# Altium schematic symbol library jlcpcb_2025_04_capacitors_extended_0402.schlib: 3594 symbols (part 13 of 20) (continued)
## GCM1555C1H120FA16D
designator C?  Capacitance: 12pF  (hidden comment: *)
Capacitor, Ceramic (MLCC), 12pF, ±1%, 50V, C0G, ±1%, SMD 0402; Manufacturer: Murata Electronics; Manufacturer Part Number: GCM1555C1H120FA16D; Package Size: 0402; JLCPCB Basic Part: No; JLCPCB Part Number: C393682; Supplier 1: LCSC; Category: Capacitors - MLCC; Supplier Part Number 1: C393682; Tolerance: ±1%; Voltage Rating: 50V; Temperature Coefficient: C0G; RoHS: Yes; ComponentLink1Description: Datasheet; ComponentLink1URL: https://wmsc.lcsc.com/wmsc/upload/file/pdf/v2/lcsc/2304140030_Murata-Electronics-GCM1555C1H120FA16D_C393682.pdf; ComponentLink2Description: JLCPCB Part URL; ComponentLink2URL: https://jlcpcb.com/partdetail/C393682; ComponentLink3Description: LCSC Part URL; ComponentLink3URL: https://lcsc.com/product-detail/Multilayer-Ceramic-Capacitors-MLCC---SMD-SMT_Murata-Electronics-Murata-Electronics-GCM1555C1H120FA16D_C393682.html
footprint CAP-0402 (0402 (1005M) Capacitor)
pins: 1, 2

## GCM1555C1H120FA16J
designator C?  Capacitance: 12pF  (hidden comment: *)
Capacitor, Ceramic (MLCC), 12pF, ±1%, 50V, ±1%, SMD 0402; Manufacturer: Murata Electronics; Manufacturer Part Number: GCM1555C1H120FA16J; Package Size: 0402; JLCPCB Basic Part: No; JLCPCB Part Number: C2168812; Supplier 1: LCSC; Category: Capacitors - MLCC; Supplier Part Number 1: C2168812; Tolerance: ±1%; Voltage Rating: 50V; RoHS: Yes; ComponentLink1Description: Datasheet; ComponentLink1URL: https://wmsc.lcsc.com/wmsc/upload/file/pdf/v2/lcsc/2202040330_Murata-Electronics-GCM1555C1H120FA16J_C2168812.pdf; ComponentLink2Description: JLCPCB Part URL; ComponentLink2URL: https://jlcpcb.com/partdetail/C2168812; ComponentLink3Description: LCSC Part URL; ComponentLink3URL: https://lcsc.com/product-detail/Multilayer-Ceramic-Capacitors-MLCC---SMD-SMT_Murata-Electronics-Murata-Electronics-GCM1555C1H120FA16J_C2168812.html
footprint CAP-0402 (0402 (1005M) Capacitor)
pins: 1, 2

## GCM1555C1H120JA16D
designator C?  Capacitance: 12pF  (hidden comment: *)
Capacitor, Ceramic (MLCC), 12pF, ±5%, 50V, C0G, ±5%, SMD 0402; Manufacturer: Murata Electronics; Manufacturer Part Number: GCM1555C1H120JA16D; Package Size: 0402; JLCPCB Basic Part: No; JLCPCB Part Number: C126495; Supplier 1: LCSC; Category: Capacitors - MLCC; Supplier Part Number 1: C126495; Tolerance: ±5%; Voltage Rating: 50V; Temperature Coefficient: C0G; RoHS: Yes; ComponentLink1Description: Datasheet; ComponentLink1URL: https://wmsc.lcsc.com/wmsc/upload/file/pdf/v2/lcsc/1811081510_Murata-Electronics-GCM1555C1H120JA16D_C126495.pdf; ComponentLink2Description: JLCPCB Part URL; ComponentLink2URL: https://jlcpcb.com/partdetail/C126495; ComponentLink3Description: LCSC Part URL; ComponentLink3URL: https://lcsc.com/product-detail/Multilayer-Ceramic-Capacitors-MLCC---SMD-SMT_Murata-Electronics-Murata-Electronics-GCM1555C1H120JA16D_C126495.html
footprint CAP-0402 (0402 (1005M) Capacitor)
pins: 1, 2

## GCM1555C1H121FA16D
designator C?  Capacitance: 120pF  (hidden comment: *)
Capacitor, Ceramic (MLCC), 120pF, ±1%, 50V, C0G, ±1%, SMD 0402; Manufacturer: Murata Electronics; Manufacturer Part Number: GCM1555C1H121FA16D; Package Size: 0402; JLCPCB Basic Part: No; JLCPCB Part Number: C126496; Supplier 1: LCSC; Category: Capacitors - MLCC; Supplier Part Number 1: C126496; Tolerance: ±1%; Voltage Rating: 50V; Temperature Coefficient: C0G; RoHS: Yes; ComponentLink1Description: Datasheet; ComponentLink1URL: https://wmsc.lcsc.com/wmsc/upload/file/pdf/v2/lcsc/1811081514_Murata-Electronics-GCM1555C1H121FA16D_C126496.pdf; ComponentLink2Description: JLCPCB Part URL; ComponentLink2URL: https://jlcpcb.com/partdetail/C126496; ComponentLink3Description: LCSC Part URL; ComponentLink3URL: https://lcsc.com/product-detail/Multilayer-Ceramic-Capacitors-MLCC---SMD-SMT_Murata-Electronics-Murata-Electronics-GCM1555C1H121FA16D_C126496.html
footprint CAP-0402 (0402 (1005M) Capacitor)
pins: 1, 2

## GCM1555C1H121JA16D
designator C?  Capacitance: 120pF  (hidden comment: *)
Capacitor, Ceramic (MLCC), 120pF, ±5%, 50V, C0G, ±5%, SMD 0402; Manufacturer: Murata Electronics; Manufacturer Part Number: GCM1555C1H121JA16D; Package Size: 0402; JLCPCB Basic Part: No; JLCPCB Part Number: C161146; Supplier 1: LCSC; Category: Capacitors - MLCC; Supplier Part Number 1: C161146; Tolerance: ±5%; Voltage Rating: 50V; Temperature Coefficient: C0G; RoHS: Yes; ComponentLink1Description: Datasheet; ComponentLink1URL: https://wmsc.lcsc.com/wmsc/upload/file/pdf/v2/lcsc/1811081551_Murata-Electronics-GCM1555C1H121JA16D_C161146.pdf; ComponentLink2Description: JLCPCB Part URL; ComponentLink2URL: https://jlcpcb.com/partdetail/C161146; ComponentLink3Description: LCSC Part URL; ComponentLink3URL: https://lcsc.com/product-detail/Multilayer-Ceramic-Capacitors-MLCC---SMD-SMT_Murata-Electronics-Murata-Electronics-GCM1555C1H121JA16D_C161146.html
footprint CAP-0402 (0402 (1005M) Capacitor)
pins: 1, 2

## GCM1555C1H130GA16D
designator C?  Capacitance: 13pF  (hidden comment: *)
Capacitor, Ceramic (MLCC), 13pF, ±2%, 50V, C0G, ±2%, SMD 0402; Manufacturer: Murata Electronics; Manufacturer Part Number: GCM1555C1H130GA16D; Package Size: 0402; JLCPCB Basic Part: No; JLCPCB Part Number: C393681; Supplier 1: LCSC; Category: Capacitors - MLCC; Supplier Part Number 1: C393681; Tolerance: ±2%; Voltage Rating: 50V; Temperature Coefficient: C0G; RoHS: Yes; ComponentLink1Description: Datasheet; ComponentLink1URL: https://wmsc.lcsc.com/wmsc/upload/file/pdf/v2/lcsc/1912111437_Murata-Electronics-GCM1555C1H130GA16D_C393681.pdf; ComponentLink2Description: JLCPCB Part URL; ComponentLink2URL: https://jlcpcb.com/partdetail/C393681; ComponentLink3Description: LCSC Part URL; ComponentLink3URL: https://lcsc.com/product-detail/Multilayer-Ceramic-Capacitors-MLCC---SMD-SMT_Murata-Electronics-Murata-Electronics-GCM1555C1H130GA16D_C393681.html
footprint CAP-0402 (0402 (1005M) Capacitor)
pins: 1, 2

## GCM1555C1H130JA16D
designator C?  Capacitance: 13pF  (hidden comment: *)
Capacitor, Ceramic (MLCC), 13pF, ±5%, 50V, ±5%, SMD 0402; Manufacturer: Murata Electronics; Manufacturer Part Number: GCM1555C1H130JA16D; Package Size: 0402; JLCPCB Basic Part: No; JLCPCB Part Number: C2195053; Supplier 1: LCSC; Category: Capacitors - MLCC; Supplier Part Number 1: C2195053; Tolerance: ±5%; Voltage Rating: 50V; RoHS: Yes; ComponentLink1Description: Datasheet; ComponentLink1URL: https://wmsc.lcsc.com/wmsc/upload/file/pdf/v2/lcsc/2308111723_Murata-Electronics-GCM1555C1H130JA16D_C2195053.pdf; ComponentLink2Description: JLCPCB Part URL; ComponentLink2URL: https://jlcpcb.com/partdetail/C2195053; ComponentLink3Description: LCSC Part URL; ComponentLink3URL: https://lcsc.com/product-detail/Multilayer-Ceramic-Capacitors-MLCC---SMD-SMT_Murata-Electronics-Murata-Electronics-GCM1555C1H130JA16D_C2195053.html
footprint CAP-0402 (0402 (1005M) Capacitor)
pins: 1, 2

## GCM1555C1H150FA16D
designator C?  Capacitance: 15pF  (hidden comment: *)
Capacitor, Ceramic (MLCC), 15pF, ±1%, 50V, ±1%, SMD 0402; Manufacturer: Murata Electronics; Manufacturer Part Number: GCM1555C1H150FA16D; Package Size: 0402; JLCPCB Basic Part: No; JLCPCB Part Number: C2169087; Supplier 1: LCSC; Category: Capacitors - MLCC; Supplier Part Number 1: C2169087; Tolerance: ±1%; Voltage Rating: 50V; RoHS: Yes; ComponentLink1Description: Datasheet; ComponentLink1URL: https://wmsc.lcsc.com/wmsc/upload/file/pdf/v2/lcsc/2202040330_Murata-Electronics-GCM1555C1H150FA16D_C2169087.pdf; ComponentLink2Description: JLCPCB Part URL; ComponentLink2URL: https://jlcpcb.com/partdetail/C2169087; ComponentLink3Description: LCSC Part URL; ComponentLink3URL: https://lcsc.com/product-detail/Multilayer-Ceramic-Capacitors-MLCC---SMD-SMT_Murata-Electronics-Murata-Electronics-GCM1555C1H150FA16D_C2169087.html
footprint CAP-0402 (0402 (1005M) Capacitor)
pins: 1, 2

## GCM1555C1H150GA16D
designator C?  Capacitance: 15pF  (hidden comment: *)
Capacitor, Ceramic (MLCC), 15pF, ±2%, 50V, ±2%, SMD 0402; Manufacturer: Murata Electronics; Manufacturer Part Number: GCM1555C1H150GA16D; Package Size: 0402; JLCPCB Basic Part: No; JLCPCB Part Number: C782036; Supplier 1: LCSC; Category: Capacitors - MLCC; Supplier Part Number 1: C782036; Tolerance: ±2%; Voltage Rating: 50V; RoHS: Yes; ComponentLink1Description: Datasheet; ComponentLink1URL: https://wmsc.lcsc.com/wmsc/upload/file/pdf/v2/lcsc/2009161209_Murata-Electronics-GCM1555C1H150GA16D_C782036.pdf; ComponentLink2Description: JLCPCB Part URL; ComponentLink2URL: https://jlcpcb.com/partdetail/C782036; ComponentLink3Description: LCSC Part URL; ComponentLink3URL: https://lcsc.com/product-detail/Multilayer-Ceramic-Capacitors-MLCC---SMD-SMT_Murata-Electronics-Murata-Electronics-GCM1555C1H150GA16D_C782036.html
footprint CAP-0402 (0402 (1005M) Capacitor)
pins: 1, 2

## GCM1555C1H150JA16D
designator C?  Capacitance: 15pF  (hidden comment: *)
Capacitor, Ceramic (MLCC), 15pF, ±5%, 50V, C0G, ±5%, SMD 0402; Manufacturer: Murata Electronics; Manufacturer Part Number: GCM1555C1H150JA16D; Package Size: 0402; JLCPCB Basic Part: No; JLCPCB Part Number: C161147; Supplier 1: LCSC; Category: Capacitors - MLCC; Supplier Part Number 1: C161147; Tolerance: ±5%; Voltage Rating: 50V; Temperature Coefficient: C0G; RoHS: Yes; ComponentLink1Description: Datasheet; ComponentLink1URL: https://wmsc.lcsc.com/wmsc/upload/file/pdf/v2/lcsc/1811081551_Murata-Electronics-GCM1555C1H150JA16D_C161147.pdf; ComponentLink2Description: JLCPCB Part URL; ComponentLink2URL: https://jlcpcb.com/partdetail/C161147; ComponentLink3Description: LCSC Part URL; ComponentLink3URL: https://lcsc.com/product-detail/Multilayer-Ceramic-Capacitors-MLCC---SMD-SMT_Murata-Electronics-Murata-Electronics-GCM1555C1H150JA16D_C161147.html
footprint CAP-0402 (0402 (1005M) Capacitor)
pins: 1, 2

## GCM1555C1H151FA16D
designator C?  Capacitance: 150pF  (hidden comment: *)
Capacitor, Ceramic (MLCC), 150pF, ±1%, 50V, ±1%, SMD 0402; Manufacturer: Murata Electronics; Manufacturer Part Number: GCM1555C1H151FA16D; Package Size: 0402; JLCPCB Basic Part: No; JLCPCB Part Number: C1864411; Supplier 1: LCSC; Category: Capacitors - MLCC; Supplier Part Number 1: C1864411; Tolerance: ±1%; Voltage Rating: 50V; RoHS: Yes; ComponentLink1Description: Datasheet; ComponentLink1URL: https://wmsc.lcsc.com/wmsc/upload/file/pdf/v2/lcsc/2109092030_Murata-Electronics-GCM1555C1H151FA16D_C1864411.pdf; ComponentLink2Description: JLCPCB Part URL; ComponentLink2URL: https://jlcpcb.com/partdetail/C1864411; ComponentLink3Description: LCSC Part URL; ComponentLink3URL: https://lcsc.com/product-detail/Multilayer-Ceramic-Capacitors-MLCC---SMD-SMT_Murata-Electronics-Murata-Electronics-GCM1555C1H151FA16D_C1864411.html
footprint CAP-0402 (0402 (1005M) Capacitor)
pins: 1, 2

## GCM1555C1H151JA16D
designator C?  Capacitance: 150pF  (hidden comment: *)
Capacitor, Ceramic (MLCC), 150pF, ±5%, 50V, C0G, ±5%, SMD 0402; Manufacturer: Murata Electronics; Manufacturer Part Number: GCM1555C1H151JA16D; Package Size: 0402; JLCPCB Basic Part: No; JLCPCB Part Number: C126497; Supplier 1: LCSC; Category: Capacitors - MLCC; Supplier Part Number 1: C126497; Tolerance: ±5%; Voltage Rating: 50V; Temperature Coefficient: C0G; RoHS: Yes; ComponentLink1Description: Datasheet; ComponentLink1URL: https://wmsc.lcsc.com/wmsc/upload/file/pdf/v2/lcsc/1811081533_Murata-Electronics-GCM1555C1H151JA16D_C126497.pdf; ComponentLink2Description: JLCPCB Part URL; ComponentLink2URL: https://jlcpcb.com/partdetail/C126497; ComponentLink3Description: LCSC Part URL; ComponentLink3URL: https://lcsc.com/product-detail/Multilayer-Ceramic-Capacitors-MLCC---SMD-SMT_Murata-Electronics-Murata-Electronics-GCM1555C1H151JA16D_C126497.html
footprint CAP-0402 (0402 (1005M) Capacitor)
pins: 1, 2

## GCM1555C1H160JA16D
designator C?  Capacitance: 16pF  (hidden comment: *)
Capacitor, Ceramic (MLCC), 16pF, ±5%, 50V, C0G, ±5%, SMD 0402; Manufacturer: Murata Electronics; Manufacturer Part Number: GCM1555C1H160JA16D; Package Size: 0402; JLCPCB Basic Part: No; JLCPCB Part Number: C710645; Supplier 1: LCSC; Category: Capacitors - MLCC; Supplier Part Number 1: C710645; Tolerance: ±5%; Voltage Rating: 50V; Temperature Coefficient: C0G; RoHS: Yes; ComponentLink1Description: Datasheet; ComponentLink1URL: https://wmsc.lcsc.com/wmsc/upload/file/pdf/v2/lcsc/2201111430_Murata-Electronics-GCM1555C1H160JA16D_C710645.pdf; ComponentLink2Description: JLCPCB Part URL; ComponentLink2URL: https://jlcpcb.com/partdetail/C710645; ComponentLink3Description: LCSC Part URL; ComponentLink3URL: https://lcsc.com/product-detail/Multilayer-Ceramic-Capacitors-MLCC---SMD-SMT_Murata-Electronics-Murata-Electronics-GCM1555C1H160JA16D_C710645.html
footprint CAP-0402 (0402 (1005M) Capacitor)
pins: 1, 2

## GCM1555C1H161JA16D
designator C?  Capacitance: 160pF  (hidden comment: *)
Capacitor, Ceramic (MLCC), 160pF, ±5%, 50V, ±5%, SMD 0402; Manufacturer: Murata Electronics; Manufacturer Part Number: GCM1555C1H161JA16D; Package Size: 0402; JLCPCB Basic Part: No; JLCPCB Part Number: C2188753; Supplier 1: LCSC; Category: Capacitors - MLCC; Supplier Part Number 1: C2188753; Tolerance: ±5%; Voltage Rating: 50V; RoHS: Yes; ComponentLink1Description: Datasheet; ComponentLink1URL: https://wmsc.lcsc.com/wmsc/upload/file/pdf/v2/lcsc/2308111721_Murata-Electronics-GCM1555C1H161JA16D_C2188753.pdf; ComponentLink2Description: JLCPCB Part URL; ComponentLink2URL: https://jlcpcb.com/partdetail/C2188753; ComponentLink3Description: LCSC Part URL; ComponentLink3URL: https://lcsc.com/product-detail/Multilayer-Ceramic-Capacitors-MLCC---SMD-SMT_Murata-Electronics-Murata-Electronics-GCM1555C1H161JA16D_C2188753.html
footprint CAP-0402 (0402 (1005M) Capacitor)
pins: 1, 2

## GCM1555C1H180FA16D
designator C?  Capacitance: 18pF  (hidden comment: *)
Capacitor, Ceramic (MLCC), 18pF, ±1%, 50V, C0G, ±1%, SMD 0402; Manufacturer: Murata Electronics; Manufacturer Part Number: GCM1555C1H180FA16D; Package Size: 0402; JLCPCB Basic Part: No; JLCPCB Part Number: C126498; Supplier 1: LCSC; Category: Capacitors - MLCC; Supplier Part Number 1: C126498; Tolerance: ±1%; Voltage Rating: 50V; Temperature Coefficient: C0G; RoHS: Yes; ComponentLink1Description: Datasheet; ComponentLink1URL: https://wmsc.lcsc.com/wmsc/upload/file/pdf/v2/lcsc/1811132114_Murata-Electronics-GCM1555C1H180FA16D_C126498.pdf; ComponentLink2Description: JLCPCB Part URL; ComponentLink2URL: https://jlcpcb.com/partdetail/C126498; ComponentLink3Description: LCSC Part URL; ComponentLink3URL: https://lcsc.com/product-detail/Multilayer-Ceramic-Capacitors-MLCC---SMD-SMT_Murata-Electronics-Murata-Electronics-GCM1555C1H180FA16D_C126498.html
footprint CAP-0402 (0402 (1005M) Capacitor)
pins: 1, 2

## GCM1555C1H180GA16D
designator C?  Capacitance: 18pF  (hidden comment: *)
Capacitor, Ceramic (MLCC), 18pF, ±2%, 50V, null, ±2%, SMD 0402; Manufacturer: Murata Electronics; Manufacturer Part Number: GCM1555C1H180GA16D; Package Size: 0402; JLCPCB Basic Part: No; JLCPCB Part Number: C882583; Supplier 1: LCSC; Category: Capacitors - MLCC; Supplier Part Number 1: C882583; Tolerance: ±2%; Voltage Rating: 50V; Temperature Coefficient: null; RoHS: Yes; ComponentLink1Description: Datasheet; ComponentLink1URL: https://wmsc.lcsc.com/wmsc/upload/file/pdf/v2/lcsc/2206211730_Murata-Electronics-GCM1555C1H180GA16D_C882583.pdf; ComponentLink2Description: JLCPCB Part URL; ComponentLink2URL: https://jlcpcb.com/partdetail/C882583; ComponentLink3Description: LCSC Part URL; ComponentLink3URL: https://lcsc.com/product-detail/Multilayer-Ceramic-Capacitors-MLCC---SMD-SMT_Murata-Electronics-Murata-Electronics-GCM1555C1H180GA16D_C882583.html
footprint CAP-0402 (0402 (1005M) Capacitor)
pins: 1, 2

## GCM1555C1H180JA16D
designator C?  Capacitance: 18pF  (hidden comment: *)
Capacitor, Ceramic (MLCC), 18pF, ±5%, 50V, C0G, ±5%, SMD 0402; Manufacturer: Murata Electronics; Manufacturer Part Number: GCM1555C1H180JA16D; Package Size: 0402; JLCPCB Basic Part: No; JLCPCB Part Number: C126499; Supplier 1: LCSC; Category: Capacitors - MLCC; Supplier Part Number 1: C126499; Tolerance: ±5%; Voltage Rating: 50V; Temperature Coefficient: C0G; RoHS: Yes; ComponentLink1Description: Datasheet; ComponentLink1URL: https://wmsc.lcsc.com/wmsc/upload/file/pdf/v2/lcsc/1811081533_Murata-Electronics-GCM1555C1H180JA16D_C126499.pdf; ComponentLink2Description: JLCPCB Part URL; ComponentLink2URL: https://jlcpcb.com/partdetail/C126499; ComponentLink3Description: LCSC Part URL; ComponentLink3URL: https://lcsc.com/product-detail/Multilayer-Ceramic-Capacitors-MLCC---SMD-SMT_Murata-Electronics-Murata-Electronics-GCM1555C1H180JA16D_C126499.html
footprint CAP-0402 (0402 (1005M) Capacitor)
pins: 1, 2

## GCM1555C1H181FA16D
designator C?  Capacitance: 180pF  (hidden comment: *)
Capacitor, Ceramic (MLCC), 180pF, ±1%, 50V, C0G, ±1%, SMD 0402; Manufacturer: Murata Electronics; Manufacturer Part Number: GCM1555C1H181FA16D; Package Size: 0402; JLCPCB Basic Part: No; JLCPCB Part Number: C437435; Supplier 1: LCSC; Category: Capacitors - MLCC; Supplier Part Number 1: C437435; Tolerance: ±1%; Voltage Rating: 50V; Temperature Coefficient: C0G; RoHS: Yes; ComponentLink1Description: Datasheet; ComponentLink1URL: https://wmsc.lcsc.com/wmsc/upload/file/pdf/v2/lcsc/2304140030_Murata-Electronics-GCM1555C1H181FA16D_C437435.pdf; ComponentLink2Description: JLCPCB Part URL; ComponentLink2URL: https://jlcpcb.com/partdetail/C437435; ComponentLink3Description: LCSC Part URL; ComponentLink3URL: https://lcsc.com/product-detail/Multilayer-Ceramic-Capacitors-MLCC---SMD-SMT_Murata-Electronics-Murata-Electronics-GCM1555C1H181FA16D_C437435.html
footprint CAP-0402 (0402 (1005M) Capacitor)
pins: 1, 2

## GCM1555C1H181JA16D
designator C?  Capacitance: 180pF  (hidden comment: *)
Capacitor, Ceramic (MLCC), 180pF, ±5%, null, ±5%, SMD 0402; Manufacturer: Murata Electronics; Manufacturer Part Number: GCM1555C1H181JA16D; Package Size: 0402; JLCPCB Basic Part: No; JLCPCB Part Number: C907742; Supplier 1: LCSC; Category: Capacitors - MLCC; Supplier Part Number 1: C907742; Tolerance: ±5%; Voltage Rating: null; RoHS: Yes; ComponentLink1Description: Datasheet; ComponentLink1URL: https://wmsc.lcsc.com/wmsc/upload/file/pdf/v2/lcsc/2201242100_Murata-Electronics-GCM1555C1H181JA16D_C907742.pdf; ComponentLink2Description: JLCPCB Part URL; ComponentLink2URL: https://jlcpcb.com/partdetail/C907742; ComponentLink3Description: LCSC Part URL; ComponentLink3URL: https://lcsc.com/product-detail/Multilayer-Ceramic-Capacitors-MLCC---SMD-SMT_Murata-Electronics-Murata-Electronics-GCM1555C1H181JA16D_C907742.html
footprint CAP-0402 (0402 (1005M) Capacitor)
pins: 1, 2

## GCM1555C1H200FA16D
designator C?  Capacitance: 20pF  (hidden comment: *)
Capacitor, Ceramic (MLCC), 20pF, ±1%, 50V, C0G, ±1%, SMD 0402; Manufacturer: Murata Electronics; Manufacturer Part Number: GCM1555C1H200FA16D; Package Size: 0402; JLCPCB Basic Part: No; JLCPCB Part Number: C437436; Supplier 1: LCSC; Category: Capacitors - MLCC; Supplier Part Number 1: C437436; Tolerance: ±1%; Voltage Rating: 50V; Temperature Coefficient: C0G; RoHS: Yes; ComponentLink1Description: Datasheet; ComponentLink1URL: https://wmsc.lcsc.com/wmsc/upload/file/pdf/v2/lcsc/2304140030_Murata-Electronics-GCM1555C1H200FA16D_C437436.pdf; ComponentLink2Description: JLCPCB Part URL; ComponentLink2URL: https://jlcpcb.com/partdetail/C437436; ComponentLink3Description: LCSC Part URL; ComponentLink3URL: https://lcsc.com/product-detail/Multilayer-Ceramic-Capacitors-MLCC---SMD-SMT_Murata-Electronics-Murata-Electronics-GCM1555C1H200FA16D_C437436.html
footprint CAP-0402 (0402 (1005M) Capacitor)
pins: 1, 2

## GCM1555C1H200JA16D
designator C?  Capacitance: 20pF  (hidden comment: *)
Capacitor, Ceramic (MLCC), 20pF, ±5%, 50V, ±5%, SMD 0402; Manufacturer: Murata Electronics; Manufacturer Part Number: GCM1555C1H200JA16D; Package Size: 0402; JLCPCB Basic Part: No; JLCPCB Part Number: C343868; Supplier 1: LCSC; Category: Capacitors - MLCC; Supplier Part Number 1: C343868; Tolerance: ±5%; Voltage Rating: 50V; RoHS: Yes; ComponentLink1Description: Datasheet; ComponentLink1URL: https://wmsc.lcsc.com/wmsc/upload/file/pdf/v2/lcsc/2304140030_Murata-Electronics-GCM1555C1H200JA16D_C343868.pdf; ComponentLink2Description: JLCPCB Part URL; ComponentLink2URL: https://jlcpcb.com/partdetail/C343868; ComponentLink3Description: LCSC Part URL; ComponentLink3URL: https://lcsc.com/product-detail/Multilayer-Ceramic-Capacitors-MLCC---SMD-SMT_Murata-Electronics-Murata-Electronics-GCM1555C1H200JA16D_C343868.html
footprint CAP-0402 (0402 (1005M) Capacitor)
pins: 1, 2

## GCM1555C1H201JA16D
designator C?  Capacitance: 200pF  (hidden comment: *)
Capacitor, Ceramic (MLCC), 200pF, ±5%, 50V, C0G, ±5%, SMD 0402; Manufacturer: Murata Electronics; Manufacturer Part Number: GCM1555C1H201JA16D; Package Size: 0402; JLCPCB Basic Part: No; JLCPCB Part Number: C710649; Supplier 1: LCSC; Category: Capacitors - MLCC; Supplier Part Number 1: C710649; Tolerance: ±5%; Voltage Rating: 50V; Temperature Coefficient: C0G; RoHS: Yes; ComponentLink1Description: Datasheet; ComponentLink1URL: https://wmsc.lcsc.com/wmsc/upload/file/pdf/v2/lcsc/2304140030_Murata-Electronics-GCM1555C1H201JA16D_C710649.pdf; ComponentLink2Description: JLCPCB Part URL; ComponentLink2URL: https://jlcpcb.com/partdetail/C710649; ComponentLink3Description: LCSC Part URL; ComponentLink3URL: https://lcsc.com/product-detail/Multilayer-Ceramic-Capacitors-MLCC---SMD-SMT_Murata-Electronics-Murata-Electronics-GCM1555C1H201JA16D_C710649.html
footprint CAP-0402 (0402 (1005M) Capacitor)
pins: 1, 2

## GCM1555C1H220FA16D
designator C?  Capacitance: 22pF  (hidden comment: *)
Capacitor, Ceramic (MLCC), 22pF, ±1%, 50V, C0G, ±1%, SMD 0402; Manufacturer: Murata Electronics; Manufacturer Part Number: GCM1555C1H220FA16D; Package Size: 0402; JLCPCB Basic Part: No; JLCPCB Part Number: C882582; Supplier 1: LCSC; Category: Capacitors - MLCC; Supplier Part Number 1: C882582; Tolerance: ±1%; Voltage Rating: 50V; Temperature Coefficient: C0G; RoHS: Yes; ComponentLink1Description: Datasheet; ComponentLink1URL: https://wmsc.lcsc.com/wmsc/upload/file/pdf/v2/lcsc/2206281830_Murata-Electronics-GCM1555C1H220FA16D_C882582.pdf; ComponentLink2Description: JLCPCB Part URL; ComponentLink2URL: https://jlcpcb.com/partdetail/C882582; ComponentLink3Description: LCSC Part URL; ComponentLink3URL: https://lcsc.com/product-detail/Multilayer-Ceramic-Capacitors-MLCC---SMD-SMT_Murata-Electronics-Murata-Electronics-GCM1555C1H220FA16D_C882582.html
footprint CAP-0402 (0402 (1005M) Capacitor)
pins: 1, 2

## GCM1555C1H220GA16D
designator C?  Capacitance: 22pF  (hidden comment: *)
Capacitor, Ceramic (MLCC), 22pF, ±2%, 50V, ±2%, SMD 0402; Manufacturer: Murata Electronics; Manufacturer Part Number: GCM1555C1H220GA16D; Package Size: 0402; JLCPCB Basic Part: No; JLCPCB Part Number: C2176129; Supplier 1: LCSC; Category: Capacitors - MLCC; Supplier Part Number 1: C2176129; Tolerance: ±2%; Voltage Rating: 50V; RoHS: Yes; ComponentLink1Description: Datasheet; ComponentLink1URL: https://wmsc.lcsc.com/wmsc/upload/file/pdf/v2/lcsc/2202040800_Murata-Electronics-GCM1555C1H220GA16D_C2176129.pdf; ComponentLink2Description: JLCPCB Part URL; ComponentLink2URL: https://jlcpcb.com/partdetail/C2176129; ComponentLink3Description: LCSC Part URL; ComponentLink3URL: https://lcsc.com/product-detail/Multilayer-Ceramic-Capacitors-MLCC---SMD-SMT_Murata-Electronics-Murata-Electronics-GCM1555C1H220GA16D_C2176129.html
footprint CAP-0402 (0402 (1005M) Capacitor)
pins: 1, 2

## GCM1555C1H220JA16D
designator C?  Capacitance: 22pF  (hidden comment: *)
Capacitor, Ceramic (MLCC), 22pF, ±5%, 50V, C0G, ±5%, SMD 0402; Manufacturer: Murata Electronics; Manufacturer Part Number: GCM1555C1H220JA16D; Package Size: 0402; JLCPCB Basic Part: No; JLCPCB Part Number: C126502; Supplier 1: LCSC; Category: Capacitors - MLCC; Supplier Part Number 1: C126502; Tolerance: ±5%; Voltage Rating: 50V; Temperature Coefficient: C0G; RoHS: Yes; ComponentLink1Description: Datasheet; ComponentLink1URL: https://wmsc.lcsc.com/wmsc/upload/file/pdf/v2/lcsc/1811081510_Murata-Electronics-GCM1555C1H220JA16D_C126502.pdf; ComponentLink2Description: JLCPCB Part URL; ComponentLink2URL: https://jlcpcb.com/partdetail/C126502; ComponentLink3Description: LCSC Part URL; ComponentLink3URL: https://lcsc.com/product-detail/Multilayer-Ceramic-Capacitors-MLCC---SMD-SMT_Murata-Electronics-Murata-Electronics-GCM1555C1H220JA16D_C126502.html
footprint CAP-0402 (0402 (1005M) Capacitor)
pins: 1, 2

## GCM1555C1H221FA16D
designator C?  Capacitance: 220pF  (hidden comment: *)
Capacitor, Ceramic (MLCC), 220pF, ±1%, 50V, C0G, ±1%, SMD 0402; Manufacturer: Murata Electronics; Manufacturer Part Number: GCM1555C1H221FA16D; Package Size: 0402; JLCPCB Basic Part: No; JLCPCB Part Number: C882581; Supplier 1: LCSC; Category: Capacitors - MLCC; Supplier Part Number 1: C882581; Tolerance: ±1%; Voltage Rating: 50V; Temperature Coefficient: C0G; RoHS: Yes; ComponentLink1Description: Datasheet; ComponentLink1URL: https://wmsc.lcsc.com/wmsc/upload/file/pdf/v2/lcsc/2206281830_Murata-Electronics-GCM1555C1H221FA16D_C882581.pdf; ComponentLink2Description: JLCPCB Part URL; ComponentLink2URL: https://jlcpcb.com/partdetail/C882581; ComponentLink3Description: LCSC Part URL; ComponentLink3URL: https://lcsc.com/product-detail/Multilayer-Ceramic-Capacitors-MLCC---SMD-SMT_Murata-Electronics-Murata-Electronics-GCM1555C1H221FA16D_C882581.html
footprint CAP-0402 (0402 (1005M) Capacitor)
pins: 1, 2

## GCM1555C1H221JA16D
designator C?  Capacitance: 220pF  (hidden comment: *)
Capacitor, Ceramic (MLCC), 220pF, ±5%, 50V, C0G, ±5%, SMD 0402; Manufacturer: Murata Electronics; Manufacturer Part Number: GCM1555C1H221JA16D; Package Size: 0402; JLCPCB Basic Part: No; JLCPCB Part Number: C126503; Supplier 1: LCSC; Category: Capacitors - MLCC; Supplier Part Number 1: C126503; Tolerance: ±5%; Voltage Rating: 50V; Temperature Coefficient: C0G; RoHS: Yes; ComponentLink1Description: Datasheet; ComponentLink1URL: https://wmsc.lcsc.com/wmsc/upload/file/pdf/v2/lcsc/1811081516_Murata-Electronics-GCM1555C1H221JA16D_C126503.pdf; ComponentLink2Description: JLCPCB Part URL; ComponentLink2URL: https://jlcpcb.com/partdetail/C126503; ComponentLink3Description: LCSC Part URL; ComponentLink3URL: https://lcsc.com/product-detail/Multilayer-Ceramic-Capacitors-MLCC---SMD-SMT_Murata-Electronics-Murata-Electronics-GCM1555C1H221JA16D_C126503.html
footprint CAP-0402 (0402 (1005M) Capacitor)
pins: 1, 2

## GCM1555C1H240JA16D
designator C?  Capacitance: 24pF  (hidden comment: *)
Capacitor, Ceramic (MLCC), 24pF, ±5%, 50V, ±5%, SMD 0402; Manufacturer: Murata Electronics; Manufacturer Part Number: GCM1555C1H240JA16D; Package Size: 0402; JLCPCB Basic Part: No; JLCPCB Part Number: C668318; Supplier 1: LCSC; Category: Capacitors - MLCC; Supplier Part Number 1: C668318; Tolerance: ±5%; Voltage Rating: 50V; RoHS: Yes; ComponentLink1Description: Datasheet; ComponentLink1URL: https://wmsc.lcsc.com/wmsc/upload/file/pdf/v2/lcsc/2112061830_Murata-Electronics-GCM1555C1H240JA16D_C668318.pdf; ComponentLink2Description: JLCPCB Part URL; ComponentLink2URL: https://jlcpcb.com/partdetail/C668318; ComponentLink3Description: LCSC Part URL; ComponentLink3URL: https://lcsc.com/product-detail/Multilayer-Ceramic-Capacitors-MLCC---SMD-SMT_Murata-Electronics-Murata-Electronics-GCM1555C1H240JA16D_C668318.html
footprint CAP-0402 (0402 (1005M) Capacitor)
pins: 1, 2

## GCM1555C1H241JA16D
designator C?  Capacitance: 240pF  (hidden comment: *)
Capacitor, Ceramic (MLCC), 240pF, ±5%, 50V, ±5%, SMD 0402; Manufacturer: Murata Electronics; Manufacturer Part Number: GCM1555C1H241JA16D; Package Size: 0402; JLCPCB Basic Part: No; JLCPCB Part Number: C2188134; Supplier 1: LCSC; Category: Capacitors - MLCC; Supplier Part Number 1: C2188134; Tolerance: ±5%; Voltage Rating: 50V; RoHS: Yes; ComponentLink1Description: Datasheet; ComponentLink1URL: https://wmsc.lcsc.com/wmsc/upload/file/pdf/v2/lcsc/2308111721_Murata-Electronics-GCM1555C1H241JA16D_C2188134.pdf; ComponentLink2Description: JLCPCB Part URL; ComponentLink2URL: https://jlcpcb.com/partdetail/C2188134; ComponentLink3Description: LCSC Part URL; ComponentLink3URL: https://lcsc.com/product-detail/Multilayer-Ceramic-Capacitors-MLCC---SMD-SMT_Murata-Electronics-Murata-Electronics-GCM1555C1H241JA16D_C2188134.html
footprint CAP-0402 (0402 (1005M) Capacitor)
pins: 1, 2

## GCM1555C1H270JA16D
designator C?  Capacitance: 27pF  (hidden comment: *)
Capacitor, Ceramic (MLCC), 27pF, ±5%, 50V, C0G, ±5%, SMD 0402; Manufacturer: Murata Electronics; Manufacturer Part Number: GCM1555C1H270JA16D; Package Size: 0402; JLCPCB Basic Part: No; JLCPCB Part Number: C126504; Supplier 1: LCSC; Category: Capacitors - MLCC; Supplier Part Number 1: C126504; Tolerance: ±5%; Voltage Rating: 50V; Temperature Coefficient: C0G; RoHS: Yes; ComponentLink1Description: Datasheet; ComponentLink1URL: https://wmsc.lcsc.com/wmsc/upload/file/pdf/v2/lcsc/1811081510_Murata-Electronics-GCM1555C1H270JA16D_C126504.pdf; ComponentLink2Description: JLCPCB Part URL; ComponentLink2URL: https://jlcpcb.com/partdetail/C126504; ComponentLink3Description: LCSC Part URL; ComponentLink3URL: https://lcsc.com/product-detail/Multilayer-Ceramic-Capacitors-MLCC---SMD-SMT_Murata-Electronics-Murata-Electronics-GCM1555C1H270JA16D_C126504.html
footprint CAP-0402 (0402 (1005M) Capacitor)
pins: 1, 2

## GCM1555C1H271JA16D
designator C?  Capacitance: 270pF  (hidden comment: *)
Capacitor, Ceramic (MLCC), 270pF, ±5%, 50V, C0G, ±5%, SMD 0402; Manufacturer: Murata Electronics; Manufacturer Part Number: GCM1555C1H271JA16D; Package Size: 0402; JLCPCB Basic Part: No; JLCPCB Part Number: C524551; Supplier 1: LCSC; Category: Capacitors - MLCC; Supplier Part Number 1: C524551; Tolerance: ±5%; Voltage Rating: 50V; Temperature Coefficient: C0G; RoHS: Yes; ComponentLink1Description: Datasheet; ComponentLink1URL: https://wmsc.lcsc.com/wmsc/upload/file/pdf/v2/lcsc/2304140030_Murata-Electronics-GCM1555C1H271JA16D_C524551.pdf; ComponentLink2Description: JLCPCB Part URL; ComponentLink2URL: https://jlcpcb.com/partdetail/C524551; ComponentLink3Description: LCSC Part URL; ComponentLink3URL: https://lcsc.com/product-detail/Multilayer-Ceramic-Capacitors-MLCC---SMD-SMT_Murata-Electronics-Murata-Electronics-GCM1555C1H271JA16D_C524551.html
footprint CAP-0402 (0402 (1005M) Capacitor)
pins: 1, 2

## GCM1555C1H300FA16D
designator C?  Capacitance: 30pF  (hidden comment: *)
Capacitor, Ceramic (MLCC), 30pF, ±1%, 50V, C0G, ±1%, SMD 0402; Manufacturer: Murata Electronics; Manufacturer Part Number: GCM1555C1H300FA16D; Package Size: 0402; JLCPCB Basic Part: No; JLCPCB Part Number: C2987943; Supplier 1: LCSC; Category: Capacitors - MLCC; Supplier Part Number 1: C2987943; Tolerance: ±1%; Voltage Rating: 50V; Temperature Coefficient: C0G; RoHS: Yes; ComponentLink1Description: Datasheet; ComponentLink1URL: https://wmsc.lcsc.com/wmsc/upload/file/pdf/v2/lcsc/2206211730_Murata-Electronics-GCM1555C1H300FA16D_C2987943.pdf; ComponentLink2Description: JLCPCB Part URL; ComponentLink2URL: https://jlcpcb.com/partdetail/C2987943; ComponentLink3Description: LCSC Part URL; ComponentLink3URL: https://lcsc.com/product-detail/Multilayer-Ceramic-Capacitors-MLCC---SMD-SMT_Murata-Electronics-Murata-Electronics-GCM1555C1H300FA16D_C2987943.html
footprint CAP-0402 (0402 (1005M) Capacitor)
pins: 1, 2

## GCM1555C1H300JA16D
designator C?  Capacitance: 30pF  (hidden comment: *)
Capacitor, Ceramic (MLCC), 30pF, ±5%, 50V, C0G, ±5%, SMD 0402; Manufacturer: Murata Electronics; Manufacturer Part Number: GCM1555C1H300JA16D; Package Size: 0402; JLCPCB Basic Part: No; JLCPCB Part Number: C161152; Supplier 1: LCSC; Category: Capacitors - MLCC; Supplier Part Number 1: C161152; Tolerance: ±5%; Voltage Rating: 50V; Temperature Coefficient: C0G; RoHS: Yes; ComponentLink1Description: Datasheet; ComponentLink1URL: https://wmsc.lcsc.com/wmsc/upload/file/pdf/v2/lcsc/1811081550_Murata-Electronics-GCM1555C1H300JA16D_C161152.pdf; ComponentLink2Description: JLCPCB Part URL; ComponentLink2URL: https://jlcpcb.com/partdetail/C161152; ComponentLink3Description: LCSC Part URL; ComponentLink3URL: https://lcsc.com/product-detail/Multilayer-Ceramic-Capacitors-MLCC---SMD-SMT_Murata-Electronics-Murata-Electronics-GCM1555C1H300JA16D_C161152.html
footprint CAP-0402 (0402 (1005M) Capacitor)
pins: 1, 2

## GCM1555C1H301FA16D
designator C?  Capacitance: 300pF  (hidden comment: *)
Capacitor, Ceramic (MLCC), 300pF, ±1%, 50V, C0G, ±1%, SMD 0402; Manufacturer: Murata Electronics; Manufacturer Part Number: GCM1555C1H301FA16D; Package Size: 0402; JLCPCB Basic Part: No; JLCPCB Part Number: C126505; Supplier 1: LCSC; Category: Capacitors - MLCC; Supplier Part Number 1: C126505; Tolerance: ±1%; Voltage Rating: 50V; Temperature Coefficient: C0G; RoHS: Yes; ComponentLink1Description: Datasheet; ComponentLink1URL: https://wmsc.lcsc.com/wmsc/upload/file/pdf/v2/lcsc/1811081510_Murata-Electronics-GCM1555C1H301FA16D_C126505.pdf; ComponentLink2Description: JLCPCB Part URL; ComponentLink2URL: https://jlcpcb.com/partdetail/C126505; ComponentLink3Description: LCSC Part URL; ComponentLink3URL: https://lcsc.com/product-detail/Multilayer-Ceramic-Capacitors-MLCC---SMD-SMT_Murata-Electronics-Murata-Electronics-GCM1555C1H301FA16D_C126505.html
footprint CAP-0402 (0402 (1005M) Capacitor)
pins: 1, 2

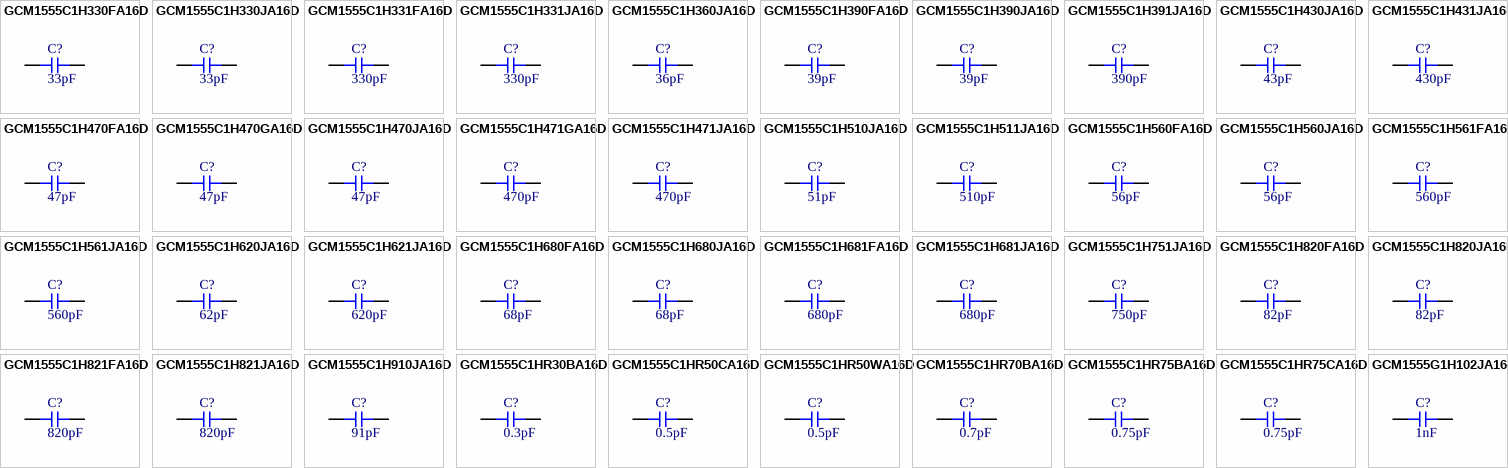
[diagram p60: symbols GCM1555C1H330FA16D to GCM1555G1H102JA16D]

## GCM1555C1H330FA16D
designator C?  Capacitance: 33pF  (hidden comment: *)
Capacitor, Ceramic (MLCC), 33pF, ±1%, 50V, C0G, ±1%, SMD 0402; Manufacturer: Murata Electronics; Manufacturer Part Number: GCM1555C1H330FA16D; Package Size: 0402; JLCPCB Basic Part: No; JLCPCB Part Number: C437439; Supplier 1: LCSC; Category: Capacitors - MLCC; Supplier Part Number 1: C437439; Tolerance: ±1%; Voltage Rating: 50V; Temperature Coefficient: C0G; RoHS: Yes; ComponentLink1Description: Datasheet; ComponentLink1URL: https://wmsc.lcsc.com/wmsc/upload/file/pdf/v2/lcsc/2304140030_Murata-Electronics-GCM1555C1H330FA16D_C437439.pdf; ComponentLink2Description: JLCPCB Part URL; ComponentLink2URL: https://jlcpcb.com/partdetail/C437439; ComponentLink3Description: LCSC Part URL; ComponentLink3URL: https://lcsc.com/product-detail/Multilayer-Ceramic-Capacitors-MLCC---SMD-SMT_Murata-Electronics-Murata-Electronics-GCM1555C1H330FA16D_C437439.html
footprint CAP-0402 (0402 (1005M) Capacitor)
pins: 1, 2

## GCM1555C1H330JA16D
designator C?  Capacitance: 33pF  (hidden comment: *)
Capacitor, Ceramic (MLCC), 33pF, ±5%, 50V, C0G, ±5%, SMD 0402; Manufacturer: Murata Electronics; Manufacturer Part Number: GCM1555C1H330JA16D; Package Size: 0402; JLCPCB Basic Part: No; JLCPCB Part Number: C126506; Supplier 1: LCSC; Category: Capacitors - MLCC; Supplier Part Number 1: C126506; Tolerance: ±5%; Voltage Rating: 50V; Temperature Coefficient: C0G; RoHS: Yes; ComponentLink1Description: Datasheet; ComponentLink1URL: https://wmsc.lcsc.com/wmsc/upload/file/pdf/v2/lcsc/1811081510_Murata-Electronics-GCM1555C1H330JA16D_C126506.pdf; ComponentLink2Description: JLCPCB Part URL; ComponentLink2URL: https://jlcpcb.com/partdetail/C126506; ComponentLink3Description: LCSC Part URL; ComponentLink3URL: https://lcsc.com/product-detail/Multilayer-Ceramic-Capacitors-MLCC---SMD-SMT_Murata-Electronics-Murata-Electronics-GCM1555C1H330JA16D_C126506.html
footprint CAP-0402 (0402 (1005M) Capacitor)
pins: 1, 2

## GCM1555C1H331FA16D
designator C?  Capacitance: 330pF  (hidden comment: *)
Capacitor, Ceramic (MLCC), 330pF, ±1%, 50V, C0G, ±1%, SMD 0402; Manufacturer: Murata Electronics; Manufacturer Part Number: GCM1555C1H331FA16D; Package Size: 0402; JLCPCB Basic Part: No; JLCPCB Part Number: C1864355; Supplier 1: LCSC; Category: Capacitors - MLCC; Supplier Part Number 1: C1864355; Tolerance: ±1%; Voltage Rating: 50V; Temperature Coefficient: C0G; RoHS: Yes; ComponentLink1Description: Datasheet; ComponentLink1URL: https://wmsc.lcsc.com/wmsc/upload/file/pdf/v2/lcsc/2201111430_Murata-Electronics-GCM1555C1H331FA16D_C1864355.pdf; ComponentLink2Description: JLCPCB Part URL; ComponentLink2URL: https://jlcpcb.com/partdetail/C1864355; ComponentLink3Description: LCSC Part URL; ComponentLink3URL: https://lcsc.com/product-detail/Multilayer-Ceramic-Capacitors-MLCC---SMD-SMT_Murata-Electronics-Murata-Electronics-GCM1555C1H331FA16D_C1864355.html
footprint CAP-0402 (0402 (1005M) Capacitor)
pins: 1, 2

## GCM1555C1H331JA16D
designator C?  Capacitance: 330pF  (hidden comment: *)
Capacitor, Ceramic (MLCC), 330pF, ±5%, 50V, C0G, ±5%, SMD 0402; Manufacturer: Murata Electronics; Manufacturer Part Number: GCM1555C1H331JA16D; Package Size: 0402; JLCPCB Basic Part: No; JLCPCB Part Number: C126507; Supplier 1: LCSC; Category: Capacitors - MLCC; Supplier Part Number 1: C126507; Tolerance: ±5%; Voltage Rating: 50V; Temperature Coefficient: C0G; RoHS: Yes; ComponentLink1Description: Datasheet; ComponentLink1URL: https://wmsc.lcsc.com/wmsc/upload/file/pdf/v2/lcsc/1811081516_Murata-Electronics-GCM1555C1H331JA16D_C126507.pdf; ComponentLink2Description: JLCPCB Part URL; ComponentLink2URL: https://jlcpcb.com/partdetail/C126507; ComponentLink3Description: LCSC Part URL; ComponentLink3URL: https://lcsc.com/product-detail/Multilayer-Ceramic-Capacitors-MLCC---SMD-SMT_Murata-Electronics-Murata-Electronics-GCM1555C1H331JA16D_C126507.html
footprint CAP-0402 (0402 (1005M) Capacitor)
pins: 1, 2

## GCM1555C1H360JA16D
designator C?  Capacitance: 36pF  (hidden comment: *)
Capacitor, Ceramic (MLCC), 36pF, ±5%, 50V, C0G, ±5%, SMD 0402; Manufacturer: Murata Electronics; Manufacturer Part Number: GCM1555C1H360JA16D; Package Size: 0402; JLCPCB Basic Part: No; JLCPCB Part Number: C161153; Supplier 1: LCSC; Category: Capacitors - MLCC; Supplier Part Number 1: C161153; Tolerance: ±5%; Voltage Rating: 50V; Temperature Coefficient: C0G; RoHS: Yes; ComponentLink1Description: Datasheet; ComponentLink1URL: https://wmsc.lcsc.com/wmsc/upload/file/pdf/v2/lcsc/1811081550_Murata-Electronics-GCM1555C1H360JA16D_C161153.pdf; ComponentLink2Description: JLCPCB Part URL; ComponentLink2URL: https://jlcpcb.com/partdetail/C161153; ComponentLink3Description: LCSC Part URL; ComponentLink3URL: https://lcsc.com/product-detail/Multilayer-Ceramic-Capacitors-MLCC---SMD-SMT_Murata-Electronics-Murata-Electronics-GCM1555C1H360JA16D_C161153.html
footprint CAP-0402 (0402 (1005M) Capacitor)
pins: 1, 2

## GCM1555C1H390FA16D
designator C?  Capacitance: 39pF  (hidden comment: *)
Capacitor, Ceramic (MLCC), 39pF, ±1%, 50V, C0G, ±1%, SMD 0402; Manufacturer: Murata Electronics; Manufacturer Part Number: GCM1555C1H390FA16D; Package Size: 0402; JLCPCB Basic Part: No; JLCPCB Part Number: C1864483; Supplier 1: LCSC; Category: Capacitors - MLCC; Supplier Part Number 1: C1864483; Tolerance: ±1%; Voltage Rating: 50V; Temperature Coefficient: C0G; RoHS: Yes; ComponentLink1Description: Datasheet; ComponentLink1URL: https://wmsc.lcsc.com/wmsc/upload/file/pdf/v2/lcsc/2201111430_Murata-Electronics-GCM1555C1H390FA16D_C1864483.pdf; ComponentLink2Description: JLCPCB Part URL; ComponentLink2URL: https://jlcpcb.com/partdetail/C1864483; ComponentLink3Description: LCSC Part URL; ComponentLink3URL: https://lcsc.com/product-detail/Multilayer-Ceramic-Capacitors-MLCC---SMD-SMT_Murata-Electronics-Murata-Electronics-GCM1555C1H390FA16D_C1864483.html
footprint CAP-0402 (0402 (1005M) Capacitor)
pins: 1, 2

## GCM1555C1H390JA16D
designator C?  Capacitance: 39pF  (hidden comment: *)
Capacitor, Ceramic (MLCC), 39pF, ±5%, 50V, C0G, ±5%, SMD 0402; Manufacturer: Murata Electronics; Manufacturer Part Number: GCM1555C1H390JA16D; Package Size: 0402; JLCPCB Basic Part: No; JLCPCB Part Number: C343867; Supplier 1: LCSC; Category: Capacitors - MLCC; Supplier Part Number 1: C343867; Tolerance: ±5%; Voltage Rating: 50V; Temperature Coefficient: C0G; RoHS: Yes; ComponentLink1Description: Datasheet; ComponentLink1URL: https://wmsc.lcsc.com/wmsc/upload/file/pdf/v2/lcsc/1912111437_Murata-Electronics-GCM1555C1H390JA16D_C343867.pdf; ComponentLink2Description: JLCPCB Part URL; ComponentLink2URL: https://jlcpcb.com/partdetail/C343867; ComponentLink3Description: LCSC Part URL; ComponentLink3URL: https://lcsc.com/product-detail/Multilayer-Ceramic-Capacitors-MLCC---SMD-SMT_Murata-Electronics-Murata-Electronics-GCM1555C1H390JA16D_C343867.html
footprint CAP-0402 (0402 (1005M) Capacitor)
pins: 1, 2

## GCM1555C1H391JA16D
designator C?  Capacitance: 390pF  (hidden comment: *)
Capacitor, Ceramic (MLCC), 390pF, ±5%, 50V, C0G, ±5%, SMD 0402; Manufacturer: Murata Electronics; Manufacturer Part Number: GCM1555C1H391JA16D; Package Size: 0402; JLCPCB Basic Part: No; JLCPCB Part Number: C723890; Supplier 1: LCSC; Category: Capacitors - MLCC; Supplier Part Number 1: C723890; Tolerance: ±5%; Voltage Rating: 50V; Temperature Coefficient: C0G; RoHS: Yes; ComponentLink1Description: Datasheet; ComponentLink1URL: https://wmsc.lcsc.com/wmsc/upload/file/pdf/v2/lcsc/2008241234_Murata-Electronics-GCM1555C1H391JA16D_C723890.pdf; ComponentLink2Description: JLCPCB Part URL; ComponentLink2URL: https://jlcpcb.com/partdetail/C723890; ComponentLink3Description: LCSC Part URL; ComponentLink3URL: https://lcsc.com/product-detail/Multilayer-Ceramic-Capacitors-MLCC---SMD-SMT_Murata-Electronics-Murata-Electronics-GCM1555C1H391JA16D_C723890.html
footprint CAP-0402 (0402 (1005M) Capacitor)
pins: 1, 2

## GCM1555C1H430JA16D
designator C?  Capacitance: 43pF  (hidden comment: *)
Capacitor, Ceramic (MLCC), 43pF, ±5%, 50V, ±5%, SMD 0402; Manufacturer: Murata Electronics; Manufacturer Part Number: GCM1555C1H430JA16D; Package Size: 0402; JLCPCB Basic Part: No; JLCPCB Part Number: C2194867; Supplier 1: LCSC; Category: Capacitors - MLCC; Supplier Part Number 1: C2194867; Tolerance: ±5%; Voltage Rating: 50V; RoHS: Yes; ComponentLink1Description: Datasheet; ComponentLink1URL: https://wmsc.lcsc.com/wmsc/upload/file/pdf/v2/lcsc/2308111723_Murata-Electronics-GCM1555C1H430JA16D_C2194867.pdf; ComponentLink2Description: JLCPCB Part URL; ComponentLink2URL: https://jlcpcb.com/partdetail/C2194867; ComponentLink3Description: LCSC Part URL; ComponentLink3URL: https://lcsc.com/product-detail/Multilayer-Ceramic-Capacitors-MLCC---SMD-SMT_Murata-Electronics-Murata-Electronics-GCM1555C1H430JA16D_C2194867.html
footprint CAP-0402 (0402 (1005M) Capacitor)
pins: 1, 2

## GCM1555C1H431JA16D
designator C?  Capacitance: 430pF  (hidden comment: *)
Capacitor, Ceramic (MLCC), 430pF, ±5%, 50V, ±5%, SMD 0402; Manufacturer: Murata Electronics; Manufacturer Part Number: GCM1555C1H431JA16D; Package Size: 0402; JLCPCB Basic Part: No; JLCPCB Part Number: C2193561; Supplier 1: LCSC; Category: Capacitors - MLCC; Supplier Part Number 1: C2193561; Tolerance: ±5%; Voltage Rating: 50V; RoHS: Yes; ComponentLink1Description: Datasheet; ComponentLink1URL: https://wmsc.lcsc.com/wmsc/upload/file/pdf/v2/lcsc/2308111722_Murata-Electronics-GCM1555C1H431JA16D_C2193561.pdf; ComponentLink2Description: JLCPCB Part URL; ComponentLink2URL: https://jlcpcb.com/partdetail/C2193561; ComponentLink3Description: LCSC Part URL; ComponentLink3URL: https://lcsc.com/product-detail/Multilayer-Ceramic-Capacitors-MLCC---SMD-SMT_Murata-Electronics-Murata-Electronics-GCM1555C1H431JA16D_C2193561.html
footprint CAP-0402 (0402 (1005M) Capacitor)
pins: 1, 2

## GCM1555C1H470FA16D
designator C?  Capacitance: 47pF  (hidden comment: *)
Capacitor, Ceramic (MLCC), 47pF, ±1%, 50V, C0G, ±1%, SMD 0402; Manufacturer: Murata Electronics; Manufacturer Part Number: GCM1555C1H470FA16D; Package Size: 0402; JLCPCB Basic Part: No; JLCPCB Part Number: C393684; Supplier 1: LCSC; Category: Capacitors - MLCC; Supplier Part Number 1: C393684; Tolerance: ±1%; Voltage Rating: 50V; Temperature Coefficient: C0G; RoHS: Yes; ComponentLink1Description: Datasheet; ComponentLink1URL: https://wmsc.lcsc.com/wmsc/upload/file/pdf/v2/lcsc/1912111437_Murata-Electronics-GCM1555C1H470FA16D_C393684.pdf; ComponentLink2Description: JLCPCB Part URL; ComponentLink2URL: https://jlcpcb.com/partdetail/C393684; ComponentLink3Description: LCSC Part URL; ComponentLink3URL: https://lcsc.com/product-detail/Multilayer-Ceramic-Capacitors-MLCC---SMD-SMT_Murata-Electronics-Murata-Electronics-GCM1555C1H470FA16D_C393684.html
footprint CAP-0402 (0402 (1005M) Capacitor)
pins: 1, 2

## GCM1555C1H470GA16D
designator C?  Capacitance: 47pF  (hidden comment: *)
Capacitor, Ceramic (MLCC), 47pF, ±2%, 50V, C0G, ±2%, SMD 0402; Manufacturer: Murata Electronics; Manufacturer Part Number: GCM1555C1H470GA16D; Package Size: 0402; JLCPCB Basic Part: No; JLCPCB Part Number: C437441; Supplier 1: LCSC; Category: Capacitors - MLCC; Supplier Part Number 1: C437441; Tolerance: ±2%; Voltage Rating: 50V; Temperature Coefficient: C0G; RoHS: Yes; ComponentLink1Description: Datasheet; ComponentLink1URL: https://wmsc.lcsc.com/wmsc/upload/file/pdf/v2/lcsc/2304140030_Murata-Electronics-GCM1555C1H470GA16D_C437441.pdf; ComponentLink2Description: JLCPCB Part URL; ComponentLink2URL: https://jlcpcb.com/partdetail/C437441; ComponentLink3Description: LCSC Part URL; ComponentLink3URL: https://lcsc.com/product-detail/Multilayer-Ceramic-Capacitors-MLCC---SMD-SMT_Murata-Electronics-Murata-Electronics-GCM1555C1H470GA16D_C437441.html
footprint CAP-0402 (0402 (1005M) Capacitor)
pins: 1, 2

## GCM1555C1H470JA16D
designator C?  Capacitance: 47pF  (hidden comment: *)
Capacitor, Ceramic (MLCC), 47pF, ±5%, 50V, C0G, ±5%, SMD 0402; Manufacturer: Murata Electronics; Manufacturer Part Number: GCM1555C1H470JA16D; Package Size: 0402; JLCPCB Basic Part: No; JLCPCB Part Number: C126511; Supplier 1: LCSC; Category: Capacitors - MLCC; Supplier Part Number 1: C126511; Tolerance: ±5%; Voltage Rating: 50V; Temperature Coefficient: C0G; RoHS: Yes; ComponentLink1Description: Datasheet; ComponentLink1URL: https://wmsc.lcsc.com/wmsc/upload/file/pdf/v2/lcsc/1811081510_Murata-Electronics-GCM1555C1H470JA16D_C126511.pdf; ComponentLink2Description: JLCPCB Part URL; ComponentLink2URL: https://jlcpcb.com/partdetail/C126511; ComponentLink3Description: LCSC Part URL; ComponentLink3URL: https://lcsc.com/product-detail/Multilayer-Ceramic-Capacitors-MLCC---SMD-SMT_Murata-Electronics-Murata-Electronics-GCM1555C1H470JA16D_C126511.html
footprint CAP-0402 (0402 (1005M) Capacitor)
pins: 1, 2

## GCM1555C1H471GA16D
designator C?  Capacitance: 470pF  (hidden comment: *)
Capacitor, Ceramic (MLCC), 470pF, ±2%, null, ±2%, SMD 0402; Manufacturer: Murata Electronics; Manufacturer Part Number: GCM1555C1H471GA16D; Package Size: 0402; JLCPCB Basic Part: No; JLCPCB Part Number: C782037; Supplier 1: LCSC; Category: Capacitors - MLCC; Supplier Part Number 1: C782037; Tolerance: ±2%; Voltage Rating: null; RoHS: Yes; ComponentLink1Description: Datasheet; ComponentLink1URL: https://wmsc.lcsc.com/wmsc/upload/file/pdf/v2/lcsc/2009161209_Murata-Electronics-GCM1555C1H471GA16D_C782037.pdf; ComponentLink2Description: JLCPCB Part URL; ComponentLink2URL: https://jlcpcb.com/partdetail/C782037; ComponentLink3Description: LCSC Part URL; ComponentLink3URL: https://lcsc.com/product-detail/Multilayer-Ceramic-Capacitors-MLCC---SMD-SMT_Murata-Electronics-Murata-Electronics-GCM1555C1H471GA16D_C782037.html
footprint CAP-0402 (0402 (1005M) Capacitor)
pins: 1, 2